# Altium schematic symbol library jlcpcb_2025_04_capacitors_extended_0603.schlib: 3668 symbols (part 8 of 20)
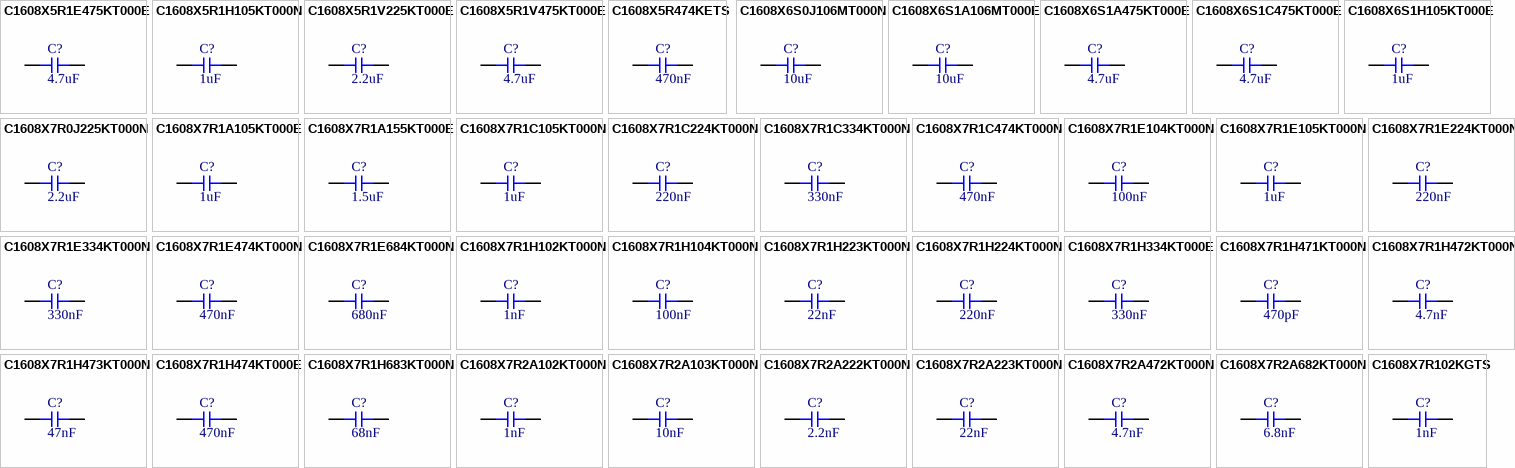
[diagram p98: symbols C1608X5R1E475KT000E to C1608X7R102KGTS]

## C1608X6S1H105KT000E
designator C?  Capacitance: 1uF  (hidden comment: *)
Capacitor, Ceramic (MLCC), 1uF, ±10%, 50V, X6S, ±10%, SMD 0603; Manufacturer: TDK; Manufacturer Part Number: C1608X6S1H105KT000E; Package Size: 0603; JLCPCB Basic Part: No; JLCPCB Part Number: C694180; Supplier 1: LCSC; Category: Capacitors - MLCC; Supplier Part Number 1: C694180; Tolerance: ±10%; Voltage Rating: 50V; Temperature Coefficient: X6S; RoHS: Yes; ComponentLink1Description: Datasheet; ComponentLink1URL: https://wmsc.lcsc.com/wmsc/upload/file/pdf/v2/lcsc/2304140030_TDK-C1608X6S1H105KT000E_C694180.pdf; ComponentLink2Description: JLCPCB Part URL; ComponentLink2URL: https://jlcpcb.com/partdetail/C694180; ComponentLink3Description: LCSC Part URL; ComponentLink3URL: https://lcsc.com/product-detail/Multilayer-Ceramic-Capacitors-MLCC---SMD-SMT_TDK-TDK-C1608X6S1H105KT000E_C694180.html
footprint CAP-0603 (0603 (1608M) Capacitor)
pins: 1, 2

## C1608X7R0J225KT000N
designator C?  Capacitance: 2.2uF  (hidden comment: *)
Capacitor, Ceramic (MLCC), 2.2uF, ±10%, 6.3V, X7R, ±10%, SMD 0603; Manufacturer: TDK; Manufacturer Part Number: C1608X7R0J225KT000N; Package Size: 0603; JLCPCB Basic Part: No; JLCPCB Part Number: C415294; Supplier 1: LCSC; Category: Capacitors - MLCC; Supplier Part Number 1: C415294; Tolerance: ±10%; Voltage Rating: 6.3V; Temperature Coefficient: X7R; RoHS: Yes; ComponentLink1Description: Datasheet; ComponentLink1URL: https://wmsc.lcsc.com/wmsc/upload/file/pdf/v2/lcsc/2304140030_TDK-C1608X7R0J225KT000N_C415294.pdf; ComponentLink2Description: JLCPCB Part URL; ComponentLink2URL: https://jlcpcb.com/partdetail/C415294; ComponentLink3Description: LCSC Part URL; ComponentLink3URL: https://lcsc.com/product-detail/Multilayer-Ceramic-Capacitors-MLCC---SMD-SMT_TDK-TDK-C1608X7R0J225KT000N_C415294.html
footprint CAP-0603 (0603 (1608M) Capacitor)
pins: 1, 2

## C1608X7R1A105KT000E
designator C?  Capacitance: 1uF  (hidden comment: *)
Capacitor, Ceramic (MLCC), 1uF, ±10%, 10V, X7R, ±10%, SMD 0603; Manufacturer: TDK; Manufacturer Part Number: C1608X7R1A105KT000E; Package Size: 0603; JLCPCB Basic Part: No; JLCPCB Part Number: C445753; Supplier 1: LCSC; Category: Capacitors - MLCC; Supplier Part Number 1: C445753; Tolerance: ±10%; Voltage Rating: 10V; Temperature Coefficient: X7R; RoHS: Yes; ComponentLink1Description: Datasheet; ComponentLink1URL: https://wmsc.lcsc.com/wmsc/upload/file/pdf/v2/lcsc/2304140030_TDK-C1608X7R1A105KT000E_C445753.pdf; ComponentLink2Description: JLCPCB Part URL; ComponentLink2URL: https://jlcpcb.com/partdetail/C445753; ComponentLink3Description: LCSC Part URL; ComponentLink3URL: https://lcsc.com/product-detail/Multilayer-Ceramic-Capacitors-MLCC---SMD-SMT_TDK-TDK-C1608X7R1A105KT000E_C445753.html
footprint CAP-0603 (0603 (1608M) Capacitor)
pins: 1, 2

## C1608X7R1A155KT000E
designator C?  Capacitance: 1.5uF  (hidden comment: *)
Capacitor, Ceramic (MLCC), 1.5uF, ±10%, 10V, X7R, ±10%, SMD 0603; Manufacturer: TDK; Manufacturer Part Number: C1608X7R1A155KT000E; Package Size: 0603; JLCPCB Basic Part: No; JLCPCB Part Number: C361193; Supplier 1: LCSC; Category: Capacitors - MLCC; Supplier Part Number 1: C361193; Tolerance: ±10%; Voltage Rating: 10V; Temperature Coefficient: X7R; RoHS: Yes; ComponentLink1Description: Datasheet; ComponentLink1URL: https://wmsc.lcsc.com/wmsc/upload/file/pdf/v2/lcsc/2304140030_TDK-C1608X7R1A155KT000E_C361193.pdf; ComponentLink2Description: JLCPCB Part URL; ComponentLink2URL: https://jlcpcb.com/partdetail/C361193; ComponentLink3Description: LCSC Part URL; ComponentLink3URL: https://lcsc.com/product-detail/Multilayer-Ceramic-Capacitors-MLCC---SMD-SMT_TDK-TDK-C1608X7R1A155KT000E_C361193.html
footprint CAP-0603 (0603 (1608M) Capacitor)
pins: 1, 2

## C1608X7R1C105KT000N
designator C?  Capacitance: 1uF  (hidden comment: *)
Capacitor, Ceramic (MLCC), 1uF, ±10%, 16V, X7R, ±10%, SMD 0603; Manufacturer: TDK; Manufacturer Part Number: C1608X7R1C105KT000N; Package Size: 0603; JLCPCB Basic Part: No; JLCPCB Part Number: C76617; Supplier 1: LCSC; Category: Capacitors - MLCC; Supplier Part Number 1: C76617; Tolerance: ±10%; Voltage Rating: 16V; Temperature Coefficient: X7R; RoHS: Yes; ComponentLink1Description: Datasheet; ComponentLink1URL: https://wmsc.lcsc.com/wmsc/upload/file/pdf/v2/lcsc/2304140030_TDK-C1608X7R1C105KT000N_C76617.pdf; ComponentLink2Description: JLCPCB Part URL; ComponentLink2URL: https://jlcpcb.com/partdetail/C76617; ComponentLink3Description: LCSC Part URL; ComponentLink3URL: https://lcsc.com/product-detail/Multilayer-Ceramic-Capacitors-MLCC---SMD-SMT_TDK-TDK-C1608X7R1C105KT000N_C76617.html
footprint CAP-0603 (0603 (1608M) Capacitor)
pins: 1, 2

## C1608X7R1C224KT000N
designator C?  Capacitance: 220nF  (hidden comment: *)
Capacitor, Ceramic (MLCC), 220nF, ±10%, 16V, X7R, ±10%, SMD 0603; Manufacturer: TDK; Manufacturer Part Number: C1608X7R1C224KT000N; Package Size: 0603; JLCPCB Basic Part: No; JLCPCB Part Number: C445748; Supplier 1: LCSC; Category: Capacitors - MLCC; Supplier Part Number 1: C445748; Tolerance: ±10%; Voltage Rating: 16V; Temperature Coefficient: X7R; RoHS: Yes; ComponentLink1Description: Datasheet; ComponentLink1URL: https://wmsc.lcsc.com/wmsc/upload/file/pdf/v2/lcsc/2304140030_TDK-C1608X7R1C224KT000N_C445748.pdf; ComponentLink2Description: JLCPCB Part URL; ComponentLink2URL: https://jlcpcb.com/partdetail/C445748; ComponentLink3Description: LCSC Part URL; ComponentLink3URL: https://lcsc.com/product-detail/Multilayer-Ceramic-Capacitors-MLCC---SMD-SMT_TDK-TDK-C1608X7R1C224KT000N_C445748.html
footprint CAP-0603 (0603 (1608M) Capacitor)
pins: 1, 2

## C1608X7R1C334KT000N
designator C?  Capacitance: 330nF  (hidden comment: *)
Capacitor, Ceramic (MLCC), 330nF, ±10%, 16V, X7R, ±10%, SMD 0603; Manufacturer: TDK; Manufacturer Part Number: C1608X7R1C334KT000N; Package Size: 0603; JLCPCB Basic Part: No; JLCPCB Part Number: C508854; Supplier 1: LCSC; Category: Capacitors - MLCC; Supplier Part Number 1: C508854; Tolerance: ±10%; Voltage Rating: 16V; Temperature Coefficient: X7R; RoHS: Yes; ComponentLink1Description: Datasheet; ComponentLink1URL: https://wmsc.lcsc.com/wmsc/upload/file/pdf/v2/lcsc/2304140030_TDK-C1608X7R1C334KT000N_C508854.pdf; ComponentLink2Description: JLCPCB Part URL; ComponentLink2URL: https://jlcpcb.com/partdetail/C508854; ComponentLink3Description: LCSC Part URL; ComponentLink3URL: https://lcsc.com/product-detail/Multilayer-Ceramic-Capacitors-MLCC---SMD-SMT_TDK-TDK-C1608X7R1C334KT000N_C508854.html
footprint CAP-0603 (0603 (1608M) Capacitor)
pins: 1, 2

## C1608X7R1C474KT000N
designator C?  Capacitance: 470nF  (hidden comment: *)
Capacitor, Ceramic (MLCC), 470nF, ±10%, 16V, X7R, ±10%, SMD 0603; Manufacturer: TDK; Manufacturer Part Number: C1608X7R1C474KT000N; Package Size: 0603; JLCPCB Basic Part: No; JLCPCB Part Number: C194073; Supplier 1: LCSC; Category: Capacitors - MLCC; Supplier Part Number 1: C194073; Tolerance: ±10%; Voltage Rating: 16V; Temperature Coefficient: X7R; RoHS: Yes; ComponentLink1Description: Datasheet; ComponentLink2Description: JLCPCB Part URL; ComponentLink2URL: https://jlcpcb.com/partdetail/C194073; ComponentLink3Description: LCSC Part URL; ComponentLink3URL: https://lcsc.com/product-detail/Multilayer-Ceramic-Capacitors-MLCC---SMD-SMT_TDK-TDK-C1608X7R1C474KT000N_C194073.html
footprint CAP-0603 (0603 (1608M) Capacitor)
pins: 1, 2

## C1608X7R1E104KT000N
designator C?  Capacitance: 100nF  (hidden comment: *)
Capacitor, Ceramic (MLCC), 100nF, ±10%, 25V, X7R, ±10%, SMD 0603; Manufacturer: TDK; Manufacturer Part Number: C1608X7R1E104KT000N; Package Size: 0603; JLCPCB Basic Part: No; JLCPCB Part Number: C338036; Supplier 1: LCSC; Category: Capacitors - MLCC; Supplier Part Number 1: C338036; Tolerance: ±10%; Voltage Rating: 25V; Temperature Coefficient: X7R; RoHS: Yes; ComponentLink1Description: Datasheet; ComponentLink1URL: https://wmsc.lcsc.com/wmsc/upload/file/pdf/v2/lcsc/2304140030_TDK-C1608X7R1E104KT000N_C338036.pdf; ComponentLink2Description: JLCPCB Part URL; ComponentLink2URL: https://jlcpcb.com/partdetail/C338036; ComponentLink3Description: LCSC Part URL; ComponentLink3URL: https://lcsc.com/product-detail/Multilayer-Ceramic-Capacitors-MLCC---SMD-SMT_TDK-TDK-C1608X7R1E104KT000N_C338036.html
footprint CAP-0603 (0603 (1608M) Capacitor)
pins: 1, 2

## C1608X7R1E105KT000N
designator C?  Capacitance: 1uF  (hidden comment: *)
Capacitor, Ceramic (MLCC), 1uF, ±10%, 25V, X7R, ±10%, SMD 0603; Manufacturer: TDK; Manufacturer Part Number: C1608X7R1E105KT000N; Package Size: 0603; JLCPCB Basic Part: No; JLCPCB Part Number: C76619; Supplier 1: LCSC; Category: Capacitors - MLCC; Supplier Part Number 1: C76619; Tolerance: ±10%; Voltage Rating: 25V; Temperature Coefficient: X7R; RoHS: Yes; ComponentLink1Description: Datasheet; ComponentLink1URL: https://wmsc.lcsc.com/wmsc/upload/file/pdf/v2/lcsc/2304140030_TDK-C1608X7R1E105KT000N_C76619.pdf; ComponentLink2Description: JLCPCB Part URL; ComponentLink2URL: https://jlcpcb.com/partdetail/C76619; ComponentLink3Description: LCSC Part URL; ComponentLink3URL: https://lcsc.com/product-detail/Multilayer-Ceramic-Capacitors-MLCC---SMD-SMT_TDK-TDK-C1608X7R1E105KT000N_C76619.html
footprint CAP-0603 (0603 (1608M) Capacitor)
pins: 1, 2

## C1608X7R1E224KT000N
designator C?  Capacitance: 220nF  (hidden comment: *)
Capacitor, Ceramic (MLCC), 220nF, ±10%, 25V, X7R, ±10%, SMD 0603; Manufacturer: TDK; Manufacturer Part Number: C1608X7R1E224KT000N; Package Size: 0603; JLCPCB Basic Part: No; JLCPCB Part Number: C445730; Supplier 1: LCSC; Category: Capacitors - MLCC; Supplier Part Number 1: C445730; Tolerance: ±10%; Voltage Rating: 25V; Temperature Coefficient: X7R; RoHS: Yes; ComponentLink1Description: Datasheet; ComponentLink1URL: https://wmsc.lcsc.com/wmsc/upload/file/pdf/v2/lcsc/2304140030_TDK-C1608X7R1E224KT000N_C445730.pdf; ComponentLink2Description: JLCPCB Part URL; ComponentLink2URL: https://jlcpcb.com/partdetail/C445730; ComponentLink3Description: LCSC Part URL; ComponentLink3URL: https://lcsc.com/product-detail/Multilayer-Ceramic-Capacitors-MLCC---SMD-SMT_TDK-TDK-C1608X7R1E224KT000N_C445730.html
footprint CAP-0603 (0603 (1608M) Capacitor)
pins: 1, 2

## C1608X7R1E334KT000N
designator C?  Capacitance: 330nF  (hidden comment: *)
Capacitor, Ceramic (MLCC), 330nF, ±10%, 25V, X7R, ±10%, SMD 0603; Manufacturer: TDK; Manufacturer Part Number: C1608X7R1E334KT000N; Package Size: 0603; JLCPCB Basic Part: No; JLCPCB Part Number: C76620; Supplier 1: LCSC; Category: Capacitors - MLCC; Supplier Part Number 1: C76620; Tolerance: ±10%; Voltage Rating: 25V; Temperature Coefficient: X7R; RoHS: Yes; ComponentLink1Description: Datasheet; ComponentLink1URL: https://wmsc.lcsc.com/wmsc/upload/file/pdf/v2/lcsc/2304140030_TDK-C1608X7R1E334KT000N_C76620.pdf; ComponentLink2Description: JLCPCB Part URL; ComponentLink2URL: https://jlcpcb.com/partdetail/C76620; ComponentLink3Description: LCSC Part URL; ComponentLink3URL: https://lcsc.com/product-detail/Multilayer-Ceramic-Capacitors-MLCC---SMD-SMT_TDK-TDK-C1608X7R1E334KT000N_C76620.html
footprint CAP-0603 (0603 (1608M) Capacitor)
pins: 1, 2

## C1608X7R1E474KT000N
designator C?  Capacitance: 470nF  (hidden comment: *)
Capacitor, Ceramic (MLCC), 470nF, ±10%, 25V, X7R, ±10%, SMD 0603; Manufacturer: TDK; Manufacturer Part Number: C1608X7R1E474KT000N; Package Size: 0603; JLCPCB Basic Part: No; JLCPCB Part Number: C694183; Supplier 1: LCSC; Category: Capacitors - MLCC; Supplier Part Number 1: C694183; Tolerance: ±10%; Voltage Rating: 25V; Temperature Coefficient: X7R; RoHS: Yes; ComponentLink1Description: Datasheet; ComponentLink1URL: https://wmsc.lcsc.com/wmsc/upload/file/pdf/v2/lcsc/2304140030_TDK-C1608X7R1E474KT000N_C694183.pdf; ComponentLink2Description: JLCPCB Part URL; ComponentLink2URL: https://jlcpcb.com/partdetail/C694183; ComponentLink3Description: LCSC Part URL; ComponentLink3URL: https://lcsc.com/product-detail/Multilayer-Ceramic-Capacitors-MLCC---SMD-SMT_TDK-TDK-C1608X7R1E474KT000N_C694183.html
footprint CAP-0603 (0603 (1608M) Capacitor)
pins: 1, 2

## C1608X7R1E684KT000N
designator C?  Capacitance: 680nF  (hidden comment: *)
Capacitor, Ceramic (MLCC), 680nF, ±10%, 25V, X7R, ±10%, SMD 0603; Manufacturer: TDK; Manufacturer Part Number: C1608X7R1E684KT000N; Package Size: 0603; JLCPCB Basic Part: No; JLCPCB Part Number: C694289; Supplier 1: LCSC; Category: Capacitors - MLCC; Supplier Part Number 1: C694289; Tolerance: ±10%; Voltage Rating: 25V; Temperature Coefficient: X7R; RoHS: Yes; ComponentLink1Description: Datasheet; ComponentLink1URL: https://wmsc.lcsc.com/wmsc/upload/file/pdf/v2/lcsc/2304140030_TDK-C1608X7R1E684KT000N_C694289.pdf; ComponentLink2Description: JLCPCB Part URL; ComponentLink2URL: https://jlcpcb.com/partdetail/C694289; ComponentLink3Description: LCSC Part URL; ComponentLink3URL: https://lcsc.com/product-detail/Multilayer-Ceramic-Capacitors-MLCC---SMD-SMT_TDK-TDK-C1608X7R1E684KT000N_C694289.html
footprint CAP-0603 (0603 (1608M) Capacitor)
pins: 1, 2

## C1608X7R1H102KT000N
designator C?  Capacitance: 1nF  (hidden comment: *)
Capacitor, Ceramic (MLCC), 1nF, ±10%, 50V, X7R, ±10%, SMD 0603; Manufacturer: TDK; Manufacturer Part Number: C1608X7R1H102KT000N; Package Size: 0603; JLCPCB Basic Part: No; JLCPCB Part Number: C432919; Supplier 1: LCSC; Category: Capacitors - MLCC; Supplier Part Number 1: C432919; Tolerance: ±10%; Voltage Rating: 50V; Temperature Coefficient: X7R; RoHS: Yes; ComponentLink1Description: Datasheet; ComponentLink1URL: https://wmsc.lcsc.com/wmsc/upload/file/pdf/v2/lcsc/2304140030_TDK-C1608X7R1H102KT000N_C432919.pdf; ComponentLink2Description: JLCPCB Part URL; ComponentLink2URL: https://jlcpcb.com/partdetail/C432919; ComponentLink3Description: LCSC Part URL; ComponentLink3URL: https://lcsc.com/product-detail/Multilayer-Ceramic-Capacitors-MLCC---SMD-SMT_TDK-TDK-C1608X7R1H102KT000N_C432919.html
footprint CAP-0603 (0603 (1608M) Capacitor)
pins: 1, 2

## C1608X7R1H104KT000N
designator C?  Capacitance: 100nF  (hidden comment: *)
Capacitor, Ceramic (MLCC), 100nF, ±10%, 50V, X7R, ±10%, SMD 0603; Manufacturer: TDK; Manufacturer Part Number: C1608X7R1H104KT000N; Package Size: 0603; JLCPCB Basic Part: No; JLCPCB Part Number: C56476; Supplier 1: LCSC; Category: Capacitors - MLCC; Supplier Part Number 1: C56476; Tolerance: ±10%; Voltage Rating: 50V; Temperature Coefficient: X7R; RoHS: Yes; ComponentLink1Description: Datasheet; ComponentLink1URL: https://wmsc.lcsc.com/wmsc/upload/file/pdf/v2/lcsc/2304140030_TDK-C1608X7R1H104KT000N_C56476.pdf; ComponentLink2Description: JLCPCB Part URL; ComponentLink2URL: https://jlcpcb.com/partdetail/C56476; ComponentLink3Description: LCSC Part URL; ComponentLink3URL: https://lcsc.com/product-detail/Multilayer-Ceramic-Capacitors-MLCC---SMD-SMT_TDK-TDK-C1608X7R1H104KT000N-_C56476.html
footprint CAP-0603 (0603 (1608M) Capacitor)
pins: 1, 2

## C1608X7R1H223KT000N
designator C?  Capacitance: 22nF  (hidden comment: *)
Capacitor, Ceramic (MLCC), 22nF, ±10%, 50V, X7R, ±10%, SMD 0603; Manufacturer: TDK; Manufacturer Part Number: C1608X7R1H223KT000N; Package Size: 0603; JLCPCB Basic Part: No; JLCPCB Part Number: C194074; Supplier 1: LCSC; Category: Capacitors - MLCC; Supplier Part Number 1: C194074; Tolerance: ±10%; Voltage Rating: 50V; Temperature Coefficient: X7R; RoHS: Yes; ComponentLink1Description: Datasheet; ComponentLink2Description: JLCPCB Part URL; ComponentLink2URL: https://jlcpcb.com/partdetail/C194074; ComponentLink3Description: LCSC Part URL; ComponentLink3URL: https://lcsc.com/product-detail/Multilayer-Ceramic-Capacitors-MLCC---SMD-SMT_TDK-TDK-C1608X7R1H223KT000N_C194074.html
footprint CAP-0603 (0603 (1608M) Capacitor)
pins: 1, 2

## C1608X7R1H224KT000N
designator C?  Capacitance: 220nF  (hidden comment: *)
Capacitor, Ceramic (MLCC), 220nF, ±10%, 50V, X7R, ±10%, SMD 0603; Manufacturer: TDK; Manufacturer Part Number: C1608X7R1H224KT000N; Package Size: 0603; JLCPCB Basic Part: No; JLCPCB Part Number: C445721; Supplier 1: LCSC; Category: Capacitors - MLCC; Supplier Part Number 1: C445721; Tolerance: ±10%; Voltage Rating: 50V; Temperature Coefficient: X7R; RoHS: Yes; ComponentLink1Description: Datasheet; ComponentLink1URL: https://wmsc.lcsc.com/wmsc/upload/file/pdf/v2/lcsc/2304140030_TDK-C1608X7R1H224KT000N_C445721.pdf; ComponentLink2Description: JLCPCB Part URL; ComponentLink2URL: https://jlcpcb.com/partdetail/C445721; ComponentLink3Description: LCSC Part URL; ComponentLink3URL: https://lcsc.com/product-detail/Multilayer-Ceramic-Capacitors-MLCC---SMD-SMT_TDK-TDK-C1608X7R1H224KT000N_C445721.html
footprint CAP-0603 (0603 (1608M) Capacitor)
pins: 1, 2

## C1608X7R1H334KT000E
designator C?  Capacitance: 330nF  (hidden comment: *)
Capacitor, Ceramic (MLCC), 330nF, ±10%, 50V, X7R, ±10%, SMD 0603; Manufacturer: TDK; Manufacturer Part Number: C1608X7R1H334KT000E; Package Size: 0603; JLCPCB Basic Part: No; JLCPCB Part Number: C76621; Supplier 1: LCSC; Category: Capacitors - MLCC; Supplier Part Number 1: C76621; Tolerance: ±10%; Voltage Rating: 50V; Temperature Coefficient: X7R; RoHS: Yes; ComponentLink1Description: Datasheet; ComponentLink1URL: https://wmsc.lcsc.com/wmsc/upload/file/pdf/v2/lcsc/2304140030_TDK-C1608X7R1H334KT000E_C76621.pdf; ComponentLink2Description: JLCPCB Part URL; ComponentLink2URL: https://jlcpcb.com/partdetail/C76621; ComponentLink3Description: LCSC Part URL; ComponentLink3URL: https://lcsc.com/product-detail/Multilayer-Ceramic-Capacitors-MLCC---SMD-SMT_TDK-TDK-C1608X7R1H334KT000E_C76621.html
footprint CAP-0603 (0603 (1608M) Capacitor)
pins: 1, 2

## C1608X7R1H471KT000N
designator C?  Capacitance: 470pF  (hidden comment: *)
Capacitor, Ceramic (MLCC), 470pF, ±10%, 50V, X7R, ±10%, SMD 0603; Manufacturer: TDK; Manufacturer Part Number: C1608X7R1H471KT000N; Package Size: 0603; JLCPCB Basic Part: No; JLCPCB Part Number: C695146; Supplier 1: LCSC; Category: Capacitors - MLCC; Supplier Part Number 1: C695146; Tolerance: ±10%; Voltage Rating: 50V; Temperature Coefficient: X7R; RoHS: Yes; ComponentLink1Description: Datasheet; ComponentLink1URL: https://wmsc.lcsc.com/wmsc/upload/file/pdf/v2/lcsc/2304140030_TDK-C1608X7R1H471KT000N_C695146.pdf; ComponentLink2Description: JLCPCB Part URL; ComponentLink2URL: https://jlcpcb.com/partdetail/C695146; ComponentLink3Description: LCSC Part URL; ComponentLink3URL: https://lcsc.com/product-detail/Multilayer-Ceramic-Capacitors-MLCC---SMD-SMT_TDK-TDK-C1608X7R1H471KT000N_C695146.html
footprint CAP-0603 (0603 (1608M) Capacitor)
pins: 1, 2

## C1608X7R1H472KT000N
designator C?  Capacitance: 4.7nF  (hidden comment: *)
Capacitor, Ceramic (MLCC), 4.7nF, ±10%, 50V, X7R, ±10%, SMD 0603; Manufacturer: TDK; Manufacturer Part Number: C1608X7R1H472KT000N; Package Size: 0603; JLCPCB Basic Part: No; JLCPCB Part Number: C516763; Supplier 1: LCSC; Category: Capacitors - MLCC; Supplier Part Number 1: C516763; Tolerance: ±10%; Voltage Rating: 50V; Temperature Coefficient: X7R; RoHS: Yes; ComponentLink1Description: Datasheet; ComponentLink1URL: https://wmsc.lcsc.com/wmsc/upload/file/pdf/v2/lcsc/2304140030_TDK-C1608X7R1H472KT000N_C516763.pdf; ComponentLink2Description: JLCPCB Part URL; ComponentLink2URL: https://jlcpcb.com/partdetail/C516763; ComponentLink3Description: LCSC Part URL; ComponentLink3URL: https://lcsc.com/product-detail/Multilayer-Ceramic-Capacitors-MLCC---SMD-SMT_TDK-TDK-C1608X7R1H472KT000N_C516763.html
footprint CAP-0603 (0603 (1608M) Capacitor)
pins: 1, 2

## C1608X7R1H473KT000N
designator C?  Capacitance: 47nF  (hidden comment: *)
Capacitor, Ceramic (MLCC), 47nF, ±10%, 50V, X7R, ±10%, SMD 0603; Manufacturer: TDK; Manufacturer Part Number: C1608X7R1H473KT000N; Package Size: 0603; JLCPCB Basic Part: No; JLCPCB Part Number: C380378; Supplier 1: LCSC; Category: Capacitors - MLCC; Supplier Part Number 1: C380378; Tolerance: ±10%; Voltage Rating: 50V; Temperature Coefficient: X7R; RoHS: Yes; ComponentLink1Description: Datasheet; ComponentLink1URL: https://wmsc.lcsc.com/wmsc/upload/file/pdf/v2/lcsc/2304140030_TDK-C1608X7R1H473KT000N_C380378.pdf; ComponentLink2Description: JLCPCB Part URL; ComponentLink2URL: https://jlcpcb.com/partdetail/C380378; ComponentLink3Description: LCSC Part URL; ComponentLink3URL: https://lcsc.com/product-detail/Multilayer-Ceramic-Capacitors-MLCC---SMD-SMT_TDK-TDK-C1608X7R1H473KT000N_C380378.html
footprint CAP-0603 (0603 (1608M) Capacitor)
pins: 1, 2

## C1608X7R1H474KT000E
designator C?  Capacitance: 470nF  (hidden comment: *)
Capacitor, Ceramic (MLCC), 470nF, ±10%, 50V, X7R, ±10%, SMD 0603; Manufacturer: TDK; Manufacturer Part Number: C1608X7R1H474KT000E; Package Size: 0603; JLCPCB Basic Part: No; JLCPCB Part Number: C361189; Supplier 1: LCSC; Category: Capacitors - MLCC; Supplier Part Number 1: C361189; Tolerance: ±10%; Voltage Rating: 50V; Temperature Coefficient: X7R; RoHS: Yes; ComponentLink1Description: Datasheet; ComponentLink1URL: https://wmsc.lcsc.com/wmsc/upload/file/pdf/v2/lcsc/2304140030_TDK-C1608X7R1H474KT000E_C361189.pdf; ComponentLink2Description: JLCPCB Part URL; ComponentLink2URL: https://jlcpcb.com/partdetail/C361189; ComponentLink3Description: LCSC Part URL; ComponentLink3URL: https://lcsc.com/product-detail/Multilayer-Ceramic-Capacitors-MLCC---SMD-SMT_TDK-TDK-C1608X7R1H474KT000E_C361189.html
footprint CAP-0603 (0603 (1608M) Capacitor)
pins: 1, 2

## C1608X7R1H683KT000N
designator C?  Capacitance: 68nF  (hidden comment: *)
Capacitor, Ceramic (MLCC), 68nF, ±10%, 50V, X7R, ±10%, SMD 0603; Manufacturer: TDK; Manufacturer Part Number: C1608X7R1H683KT000N; Package Size: 0603; JLCPCB Basic Part: No; JLCPCB Part Number: C694291; Supplier 1: LCSC; Category: Capacitors - MLCC; Supplier Part Number 1: C694291; Tolerance: ±10%; Voltage Rating: 50V; Temperature Coefficient: X7R; RoHS: Yes; ComponentLink1Description: Datasheet; ComponentLink1URL: https://wmsc.lcsc.com/wmsc/upload/file/pdf/v2/lcsc/2304140030_TDK-C1608X7R1H683KT000N_C694291.pdf; ComponentLink2Description: JLCPCB Part URL; ComponentLink2URL: https://jlcpcb.com/partdetail/C694291; ComponentLink3Description: LCSC Part URL; ComponentLink3URL: https://lcsc.com/product-detail/Multilayer-Ceramic-Capacitors-MLCC---SMD-SMT_TDK-TDK-C1608X7R1H683KT000N_C694291.html
footprint CAP-0603 (0603 (1608M) Capacitor)
pins: 1, 2

## C1608X7R2A102KT000N
designator C?  Capacitance: 1nF  (hidden comment: *)
Capacitor, Ceramic (MLCC), 1nF, ±10%, 100V, X7R, ±10%, SMD 0603; Manufacturer: TDK; Manufacturer Part Number: C1608X7R2A102KT000N; Package Size: 0603; JLCPCB Basic Part: No; JLCPCB Part Number: C342527; Supplier 1: LCSC; Category: Capacitors - MLCC; Supplier Part Number 1: C342527; Tolerance: ±10%; Voltage Rating: 100V; Temperature Coefficient: X7R; RoHS: Yes; ComponentLink1Description: Datasheet; ComponentLink1URL: https://wmsc.lcsc.com/wmsc/upload/file/pdf/v2/lcsc/2304140030_TDK-C1608X7R2A102KT000N_C342527.pdf; ComponentLink2Description: JLCPCB Part URL; ComponentLink2URL: https://jlcpcb.com/partdetail/C342527; ComponentLink3Description: LCSC Part URL; ComponentLink3URL: https://lcsc.com/product-detail/Multilayer-Ceramic-Capacitors-MLCC---SMD-SMT_TDK-TDK-C1608X7R2A102KT000N_C342527.html
footprint CAP-0603 (0603 (1608M) Capacitor)
pins: 1, 2

## C1608X7R2A103KT000N
designator C?  Capacitance: 10nF  (hidden comment: *)
Capacitor, Ceramic (MLCC), 10nF, ±10%, 100V, X7R, ±10%, SMD 0603; Manufacturer: TDK; Manufacturer Part Number: C1608X7R2A103KT000N; Package Size: 0603; JLCPCB Basic Part: No; JLCPCB Part Number: C342523; Supplier 1: LCSC; Category: Capacitors - MLCC; Supplier Part Number 1: C342523; Tolerance: ±10%; Voltage Rating: 100V; Temperature Coefficient: X7R; RoHS: Yes; ComponentLink1Description: Datasheet; ComponentLink1URL: https://wmsc.lcsc.com/wmsc/upload/file/pdf/v2/lcsc/2304140030_TDK-C1608X7R2A103KT000N_C342523.pdf; ComponentLink2Description: JLCPCB Part URL; ComponentLink2URL: https://jlcpcb.com/partdetail/C342523; ComponentLink3Description: LCSC Part URL; ComponentLink3URL: https://lcsc.com/product-detail/Multilayer-Ceramic-Capacitors-MLCC---SMD-SMT_TDK-TDK-C1608X7R2A103KT000N_C342523.html
footprint CAP-0603 (0603 (1608M) Capacitor)
pins: 1, 2

## C1608X7R2A222KT000N
designator C?  Capacitance: 2.2nF  (hidden comment: *)
Capacitor, Ceramic (MLCC), 2.2nF, ±10%, 100V, X7R, ±10%, SMD 0603; Manufacturer: TDK; Manufacturer Part Number: C1608X7R2A222KT000N; Package Size: 0603; JLCPCB Basic Part: No; JLCPCB Part Number: C342518; Supplier 1: LCSC; Category: Capacitors - MLCC; Supplier Part Number 1: C342518; Tolerance: ±10%; Voltage Rating: 100V; Temperature Coefficient: X7R; RoHS: Yes; ComponentLink1Description: Datasheet; ComponentLink1URL: https://wmsc.lcsc.com/wmsc/upload/file/pdf/v2/lcsc/2304140030_TDK-C1608X7R2A222KT000N_C342518.pdf; ComponentLink2Description: JLCPCB Part URL; ComponentLink2URL: https://jlcpcb.com/partdetail/C342518; ComponentLink3Description: LCSC Part URL; ComponentLink3URL: https://lcsc.com/product-detail/Multilayer-Ceramic-Capacitors-MLCC---SMD-SMT_TDK-TDK-C1608X7R2A222KT000N_C342518.html
footprint CAP-0603 (0603 (1608M) Capacitor)
pins: 1, 2

## C1608X7R2A223KT000N
designator C?  Capacitance: 22nF  (hidden comment: *)
Capacitor, Ceramic (MLCC), 22nF, ±10%, 100V, X7R, ±10%, SMD 0603; Manufacturer: TDK; Manufacturer Part Number: C1608X7R2A223KT000N; Package Size: 0603; JLCPCB Basic Part: No; JLCPCB Part Number: C342519; Supplier 1: LCSC; Category: Capacitors - MLCC; Supplier Part Number 1: C342519; Tolerance: ±10%; Voltage Rating: 100V; Temperature Coefficient: X7R; RoHS: Yes; ComponentLink1Description: Datasheet; ComponentLink1URL: https://wmsc.lcsc.com/wmsc/upload/file/pdf/v2/lcsc/1912111437_TDK-C1608X7R2A223KT000N_C342519.pdf; ComponentLink2Description: JLCPCB Part URL; ComponentLink2URL: https://jlcpcb.com/partdetail/C342519; ComponentLink3Description: LCSC Part URL; ComponentLink3URL: https://lcsc.com/product-detail/Multilayer-Ceramic-Capacitors-MLCC---SMD-SMT_TDK-TDK-C1608X7R2A223KT000N_C342519.html
footprint CAP-0603 (0603 (1608M) Capacitor)
pins: 1, 2

## C1608X7R2A472KT000N
designator C?  Capacitance: 4.7nF  (hidden comment: *)
Capacitor, Ceramic (MLCC), 4.7nF, ±10%, 100V, X7R, ±10%, SMD 0603; Manufacturer: TDK; Manufacturer Part Number: C1608X7R2A472KT000N; Package Size: 0603; JLCPCB Basic Part: No; JLCPCB Part Number: C342520; Supplier 1: LCSC; Category: Capacitors - MLCC; Supplier Part Number 1: C342520; Tolerance: ±10%; Voltage Rating: 100V; Temperature Coefficient: X7R; RoHS: Yes; ComponentLink1Description: Datasheet; ComponentLink1URL: https://wmsc.lcsc.com/wmsc/upload/file/pdf/v2/lcsc/2304140030_TDK-C1608X7R2A472KT000N_C342520.pdf; ComponentLink2Description: JLCPCB Part URL; ComponentLink2URL: https://jlcpcb.com/partdetail/C342520; ComponentLink3Description: LCSC Part URL; ComponentLink3URL: https://lcsc.com/product-detail/Multilayer-Ceramic-Capacitors-MLCC---SMD-SMT_TDK-TDK-C1608X7R2A472KT000N_C342520.html
footprint CAP-0603 (0603 (1608M) Capacitor)
pins: 1, 2

## C1608X7R2A682KT000N
designator C?  Capacitance: 6.8nF  (hidden comment: *)
Capacitor, Ceramic (MLCC), 6.8nF, ±10%, 100V, X7R, ±10%, SMD 0603; Manufacturer: TDK; Manufacturer Part Number: C1608X7R2A682KT000N; Package Size: 0603; JLCPCB Basic Part: No; JLCPCB Part Number: C694293; Supplier 1: LCSC; Category: Capacitors - MLCC; Supplier Part Number 1: C694293; Tolerance: ±10%; Voltage Rating: 100V; Temperature Coefficient: X7R; RoHS: Yes; ComponentLink1Description: Datasheet; ComponentLink1URL: https://wmsc.lcsc.com/wmsc/upload/file/pdf/v2/lcsc/2304140030_TDK-C1608X7R2A682KT000N_C694293.pdf; ComponentLink2Description: JLCPCB Part URL; ComponentLink2URL: https://jlcpcb.com/partdetail/C694293; ComponentLink3Description: LCSC Part URL; ComponentLink3URL: https://lcsc.com/product-detail/Multilayer-Ceramic-Capacitors-MLCC---SMD-SMT_TDK-TDK-C1608X7R2A682KT000N_C694293.html
footprint CAP-0603 (0603 (1608M) Capacitor)
pins: 1, 2

## C1608X7R102KGTS
designator C?  Capacitance: 1nF  (hidden comment: *)
Capacitor, Ceramic (MLCC), 1nF, ±10%, 50V, X7R, ±10%, SMD 0603; Manufacturer: Darfon Elec; Manufacturer Part Number: C1608X7R102KGTS; Package Size: 0603; JLCPCB Basic Part: No; JLCPCB Part Number: C718541; Supplier 1: LCSC; Category: Capacitors - MLCC; Supplier Part Number 1: C718541; Tolerance: ±10%; Voltage Rating: 50V; Temperature Coefficient: X7R; RoHS: Yes; ComponentLink1Description: Datasheet; ComponentLink1URL: https://wmsc.lcsc.com/wmsc/upload/file/pdf/v2/lcsc/2304140030_Darfon-Elec-C1608X7R102KGTS_C718541.pdf; ComponentLink2Description: JLCPCB Part URL; ComponentLink2URL: https://jlcpcb.com/partdetail/C718541; ComponentLink3Description: LCSC Part URL; ComponentLink3URL: https://lcsc.com/product-detail/Multilayer-Ceramic-Capacitors-MLCC---SMD-SMT_Darfon-Elec-Darfon-Elec-C1608X7R102KGTS_C718541.html
footprint CAP-0603 (0603 (1608M) Capacitor)
pins: 1, 2

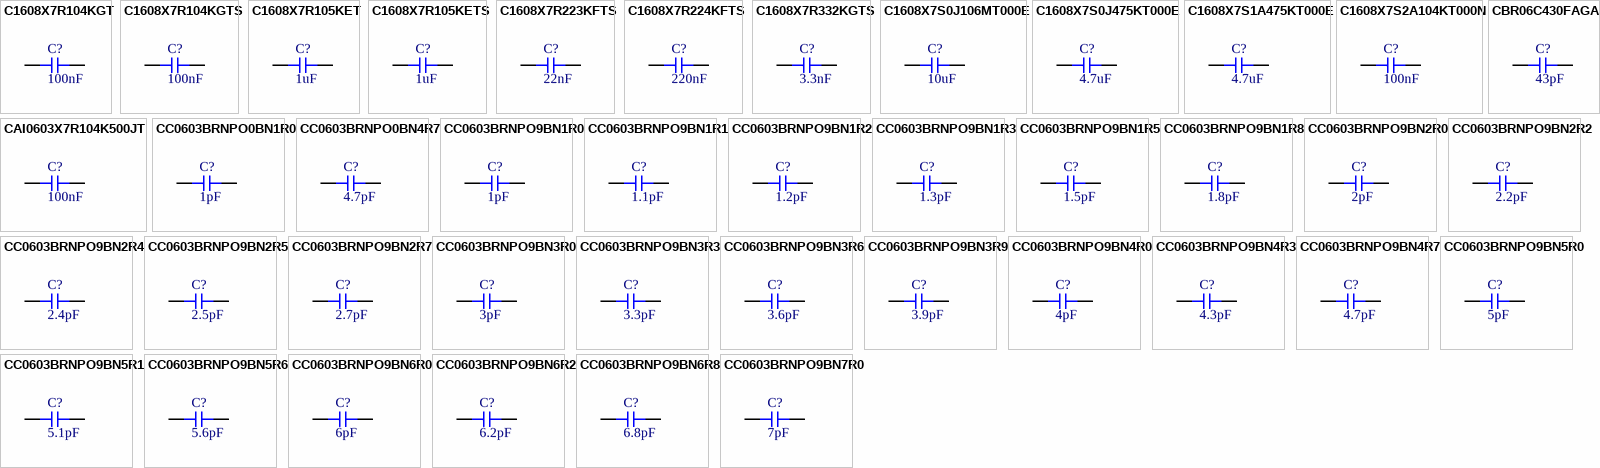
[diagram p33: symbols C1608X7R104KGT to CC0603BRNPO9BN7R0]

## C1608X7R104KGT
designator C?  Capacitance: 100nF  (hidden comment: *)
Capacitor, Ceramic (MLCC), 100nF, ±10%, 50V, X7R, ±10%, SMD 0603; Manufacturer: Darfon Elec; Manufacturer Part Number: C1608X7R104KGT; Package Size: 0603; JLCPCB Basic Part: No; JLCPCB Part Number: C701321; Supplier 1: LCSC; Category: Capacitors - MLCC; Supplier Part Number 1: C701321; Tolerance: ±10%; Voltage Rating: 50V; Temperature Coefficient: X7R; RoHS: Yes; ComponentLink1Description: Datasheet; ComponentLink1URL: https://wmsc.lcsc.com/wmsc/upload/file/pdf/v2/lcsc/2304140030_Darfon-Elec-C1608X7R104KGT_C701321.pdf; ComponentLink2Description: JLCPCB Part URL; ComponentLink2URL: https://jlcpcb.com/partdetail/C701321; ComponentLink3Description: LCSC Part URL; ComponentLink3URL: https://lcsc.com/product-detail/Multilayer-Ceramic-Capacitors-MLCC---SMD-SMT_Darfon-Elec-Darfon-Elec-C1608X7R104KGT_C701321.html
footprint CAP-0603 (0603 (1608M) Capacitor)
pins: 1, 2

## C1608X7R104KGTS
designator C?  Capacitance: 100nF  (hidden comment: *)
Capacitor, Ceramic (MLCC), 100nF, ±10%, 50V, X7R, ±10%, SMD 0603; Manufacturer: Darfon Elec; Manufacturer Part Number: C1608X7R104KGTS; Package Size: 0603; JLCPCB Basic Part: No; JLCPCB Part Number: C335111; Supplier 1: LCSC; Category: Capacitors - MLCC; Supplier Part Number 1: C335111; Tolerance: ±10%; Voltage Rating: 50V; Temperature Coefficient: X7R; RoHS: Yes; ComponentLink1Description: Datasheet; ComponentLink1URL: https://wmsc.lcsc.com/wmsc/upload/file/pdf/v2/lcsc/2304140030_Darfon-Elec-C1608X7R104KGTS_C335111.pdf; ComponentLink2Description: JLCPCB Part URL; ComponentLink2URL: https://jlcpcb.com/partdetail/C335111; ComponentLink3Description: LCSC Part URL; ComponentLink3URL: https://lcsc.com/product-detail/Multilayer-Ceramic-Capacitors-MLCC---SMD-SMT_Darfon-Elec-Darfon-Elec-C1608X7R104KGTS_C335111.html
footprint CAP-0603 (0603 (1608M) Capacitor)
pins: 1, 2

## C1608X7R105KET
designator C?  Capacitance: 1uF  (hidden comment: *)
Capacitor, Ceramic (MLCC), 1uF, ±10%, 16V, X7R, ±10%, SMD 0603; Manufacturer: Darfon Elec; Manufacturer Part Number: C1608X7R105KET; Package Size: 0603; JLCPCB Basic Part: No; JLCPCB Part Number: C701320; Supplier 1: LCSC; Category: Capacitors - MLCC; Supplier Part Number 1: C701320; Tolerance: ±10%; Voltage Rating: 16V; Temperature Coefficient: X7R; RoHS: Yes; ComponentLink1Description: Datasheet; ComponentLink1URL: https://wmsc.lcsc.com/wmsc/upload/file/pdf/v2/lcsc/2304140030_Darfon-Elec-C1608X7R105KET_C701320.pdf; ComponentLink2Description: JLCPCB Part URL; ComponentLink2URL: https://jlcpcb.com/partdetail/C701320; ComponentLink3Description: LCSC Part URL; ComponentLink3URL: https://lcsc.com/product-detail/Multilayer-Ceramic-Capacitors-MLCC---SMD-SMT_Darfon-Elec-Darfon-Elec-C1608X7R105KET_C701320.html
footprint CAP-0603 (0603 (1608M) Capacitor)
pins: 1, 2

## C1608X7R105KETS
designator C?  Capacitance: 1uF  (hidden comment: *)
Capacitor, Ceramic (MLCC), 1uF, ±10%, 16V, X7R, ±10%, SMD 0603; Manufacturer: Darfon Elec; Manufacturer Part Number: C1608X7R105KETS; Package Size: 0603; JLCPCB Basic Part: No; JLCPCB Part Number: C725572; Supplier 1: LCSC; Category: Capacitors - MLCC; Supplier Part Number 1: C725572; Tolerance: ±10%; Voltage Rating: 16V; Temperature Coefficient: X7R; RoHS: Yes; ComponentLink1Description: Datasheet; ComponentLink1URL: https://wmsc.lcsc.com/wmsc/upload/file/pdf/v2/lcsc/2304140030_Darfon-Elec-C1608X7R105KETS_C725572.pdf; ComponentLink2Description: JLCPCB Part URL; ComponentLink2URL: https://jlcpcb.com/partdetail/C725572; ComponentLink3Description: LCSC Part URL; ComponentLink3URL: https://lcsc.com/product-detail/Multilayer-Ceramic-Capacitors-MLCC---SMD-SMT_Darfon-Elec-Darfon-Elec-C1608X7R105KETS_C725572.html
footprint CAP-0603 (0603 (1608M) Capacitor)
pins: 1, 2

## C1608X7R223KFTS
designator C?  Capacitance: 22nF  (hidden comment: *)
Capacitor, Ceramic (MLCC), 22nF, ±10%, 25V, X7R, ±10%, SMD 0603; Manufacturer: Darfon Elec; Manufacturer Part Number: C1608X7R223KFTS; Package Size: 0603; JLCPCB Basic Part: No; JLCPCB Part Number: C561175; Supplier 1: LCSC; Category: Capacitors - MLCC; Supplier Part Number 1: C561175; Tolerance: ±10%; Voltage Rating: 25V; Temperature Coefficient: X7R; RoHS: Yes; ComponentLink1Description: Datasheet; ComponentLink1URL: https://wmsc.lcsc.com/wmsc/upload/file/pdf/v2/lcsc/2006011904_Darfon-Elec-C1608X7R223KFTS_C561175.pdf; ComponentLink2Description: JLCPCB Part URL; ComponentLink2URL: https://jlcpcb.com/partdetail/C561175; ComponentLink3Description: LCSC Part URL; ComponentLink3URL: https://lcsc.com/product-detail/Multilayer-Ceramic-Capacitors-MLCC---SMD-SMT_Darfon-Elec-Darfon-Elec-C1608X7R223KFTS_C561175.html
footprint CAP-0603 (0603 (1608M) Capacitor)
pins: 1, 2

## C1608X7R224KFTS
designator C?  Capacitance: 220nF  (hidden comment: *)
Capacitor, Ceramic (MLCC), 220nF, ±10%, 25V, X5R, ±10%, SMD 0603; Manufacturer: Darfon Elec; Manufacturer Part Number: C1608X7R224KFTS; Package Size: 0603; JLCPCB Basic Part: No; JLCPCB Part Number: C911096; Supplier 1: LCSC; Category: Capacitors - MLCC; Supplier Part Number 1: C911096; Tolerance: ±10%; Voltage Rating: 25V; Temperature Coefficient: X5R; RoHS: Yes; ComponentLink1Description: Datasheet; ComponentLink1URL: https://wmsc.lcsc.com/wmsc/upload/file/pdf/v2/lcsc/2010292207_Darfon-Elec-C1608X7R224KFTS_C911096.pdf; ComponentLink2Description: JLCPCB Part URL; ComponentLink2URL: https://jlcpcb.com/partdetail/C911096; ComponentLink3Description: LCSC Part URL; ComponentLink3URL: https://lcsc.com/product-detail/Multilayer-Ceramic-Capacitors-MLCC---SMD-SMT_Darfon-Elec-Darfon-Elec-C1608X7R224KFTS_C911096.html
footprint CAP-0603 (0603 (1608M) Capacitor)
pins: 1, 2

## C1608X7R332KGTS
designator C?  Capacitance: 3.3nF  (hidden comment: *)
Capacitor, Ceramic (MLCC), 3.3nF, ±10%, 50V, X7R, ±10%, SMD 0603; Manufacturer: Darfon Elec; Manufacturer Part Number: C1608X7R332KGTS; Package Size: 0603; JLCPCB Basic Part: No; JLCPCB Part Number: C561177; Supplier 1: LCSC; Category: Capacitors - MLCC; Supplier Part Number 1: C561177; Tolerance: ±10%; Voltage Rating: 50V; Temperature Coefficient: X7R; RoHS: Yes; ComponentLink1Description: Datasheet; ComponentLink1URL: https://wmsc.lcsc.com/wmsc/upload/file/pdf/v2/lcsc/2304140030_Darfon-Elec-C1608X7R332KGTS_C561177.pdf; ComponentLink2Description: JLCPCB Part URL; ComponentLink2URL: https://jlcpcb.com/partdetail/C561177; ComponentLink3Description: LCSC Part URL; ComponentLink3URL: https://lcsc.com/product-detail/Multilayer-Ceramic-Capacitors-MLCC---SMD-SMT_Darfon-Elec-Darfon-Elec-C1608X7R332KGTS_C561177.html
footprint CAP-0603 (0603 (1608M) Capacitor)
pins: 1, 2

## C1608X7S0J106MT000E
designator C?  Capacitance: 10uF  (hidden comment: *)
Capacitor, Ceramic (MLCC), 10uF, ±20%, 6.3V, X7S, ±20%, SMD 0603; Manufacturer: TDK; Manufacturer Part Number: C1608X7S0J106MT000E; Package Size: 0603; JLCPCB Basic Part: No; JLCPCB Part Number: C342847; Supplier 1: LCSC; Category: Capacitors - MLCC; Supplier Part Number 1: C342847; Tolerance: ±20%; Voltage Rating: 6.3V; Temperature Coefficient: X7S; RoHS: Yes; ComponentLink1Description: Datasheet; ComponentLink1URL: https://wmsc.lcsc.com/wmsc/upload/file/pdf/v2/lcsc/2304140030_TDK-C1608X7S0J106MT000E_C342847.pdf; ComponentLink2Description: JLCPCB Part URL; ComponentLink2URL: https://jlcpcb.com/partdetail/C342847; ComponentLink3Description: LCSC Part URL; ComponentLink3URL: https://lcsc.com/product-detail/Multilayer-Ceramic-Capacitors-MLCC---SMD-SMT_TDK-TDK-C1608X7S0J106MT000E_C342847.html
footprint CAP-0603 (0603 (1608M) Capacitor)
pins: 1, 2

## C1608X7S0J475KT000E
designator C?  Capacitance: 4.7uF  (hidden comment: *)
Capacitor, Ceramic (MLCC), 4.7uF, ±10%, 6.3V, X7S, ±10%, SMD 0603; Manufacturer: TDK; Manufacturer Part Number: C1608X7S0J475KT000E; Package Size: 0603; JLCPCB Basic Part: No; JLCPCB Part Number: C342970; Supplier 1: LCSC; Category: Capacitors - MLCC; Supplier Part Number 1: C342970; Tolerance: ±10%; Voltage Rating: 6.3V; Temperature Coefficient: X7S; RoHS: Yes; ComponentLink1Description: Datasheet; ComponentLink1URL: https://wmsc.lcsc.com/wmsc/upload/file/pdf/v2/lcsc/2304140030_TDK-C1608X7S0J475KT000E_C342970.pdf; ComponentLink2Description: JLCPCB Part URL; ComponentLink2URL: https://jlcpcb.com/partdetail/C342970; ComponentLink3Description: LCSC Part URL; ComponentLink3URL: https://lcsc.com/product-detail/Multilayer-Ceramic-Capacitors-MLCC---SMD-SMT_TDK-TDK-C1608X7S0J475KT000E_C342970.html
footprint CAP-0603 (0603 (1608M) Capacitor)
pins: 1, 2

## C1608X7S1A475KT000E
designator C?  Capacitance: 4.7uF  (hidden comment: *)
Capacitor, Ceramic (MLCC), 4.7uF, ±10%, 10V, X7S, ±10%, SMD 0603; Manufacturer: TDK; Manufacturer Part Number: C1608X7S1A475KT000E; Package Size: 0603; JLCPCB Basic Part: No; JLCPCB Part Number: C342959; Supplier 1: LCSC; Category: Capacitors - MLCC; Supplier Part Number 1: C342959; Tolerance: ±10%; Voltage Rating: 10V; Temperature Coefficient: X7S; RoHS: Yes; ComponentLink1Description: Datasheet; ComponentLink1URL: https://wmsc.lcsc.com/wmsc/upload/file/pdf/v2/lcsc/2304140030_TDK-C1608X7S1A475KT000E_C342959.pdf; ComponentLink2Description: JLCPCB Part URL; ComponentLink2URL: https://jlcpcb.com/partdetail/C342959; ComponentLink3Description: LCSC Part URL; ComponentLink3URL: https://lcsc.com/product-detail/Multilayer-Ceramic-Capacitors-MLCC---SMD-SMT_TDK-TDK-C1608X7S1A475KT000E_C342959.html
footprint CAP-0603 (0603 (1608M) Capacitor)
pins: 1, 2

## C1608X7S2A104KT000N
designator C?  Capacitance: 100nF  (hidden comment: *)
Capacitor, Ceramic (MLCC), 100nF, ±10%, 100V, X7S, ±10%, SMD 0603; Manufacturer: TDK; Manufacturer Part Number: C1608X7S2A104KT000N; Package Size: 0603; JLCPCB Basic Part: No; JLCPCB Part Number: C343025; Supplier 1: LCSC; Category: Capacitors - MLCC; Supplier Part Number 1: C343025; Tolerance: ±10%; Voltage Rating: 100V; Temperature Coefficient: X7S; RoHS: Yes; ComponentLink1Description: Datasheet; ComponentLink1URL: https://wmsc.lcsc.com/wmsc/upload/file/pdf/v2/lcsc/2304140030_TDK-C1608X7S2A104KT000N_C343025.pdf; ComponentLink2Description: JLCPCB Part URL; ComponentLink2URL: https://jlcpcb.com/partdetail/C343025; ComponentLink3Description: LCSC Part URL; ComponentLink3URL: https://lcsc.com/product-detail/Multilayer-Ceramic-Capacitors-MLCC---SMD-SMT_TDK-TDK-C1608X7S2A104KT000N_C343025.html
footprint CAP-0603 (0603 (1608M) Capacitor)
pins: 1, 2

## CAI0603X7R104K500JT
designator C?  Capacitance: 100nF  (hidden comment: *)
Capacitor, Ceramic (MLCC), 100nF, ±10%, 50V, X7R, ±10%, SMD 0603; Manufacturer: HRE; Manufacturer Part Number: CAI0603X7R104K500JT; Package Size: 0603; JLCPCB Basic Part: No; JLCPCB Part Number: C7496657; Supplier 1: LCSC; Category: Capacitors - MLCC; Supplier Part Number 1: C7496657; Tolerance: ±10%; Voltage Rating: 50V; Temperature Coefficient: X7R; RoHS: Yes; ComponentLink1Description: Datasheet; ComponentLink1URL: https://wmsc.lcsc.com/wmsc/upload/file/pdf/v2/lcsc/2401151607_HRE-CAI0603X7R104K500JT_C7496657.pdf; ComponentLink2Description: JLCPCB Part URL; ComponentLink2URL: https://jlcpcb.com/partdetail/C7496657; ComponentLink3Description: LCSC Part URL; ComponentLink3URL: https://lcsc.com/product-detail/Multilayer-Ceramic-Capacitors-MLCC---SMD-SMT_HRE-HRE-CAI0603X7R104K500JT_C7496657.html
footprint CAP-0603 (0603 (1608M) Capacitor)
pins: 1, 2

## CBR06C430FAGAC
designator C?  Capacitance: 43pF  (hidden comment: *)
Capacitor, Ceramic (MLCC), 43pF, ±1%, 250V, null, ±1%, SMD 0603; Manufacturer: KEMET; Manufacturer Part Number: CBR06C430FAGAC; Package Size: 0603; JLCPCB Basic Part: No; JLCPCB Part Number: C2170918; Supplier 1: LCSC; Category: Capacitors - MLCC; Supplier Part Number 1: C2170918; Tolerance: ±1%; Voltage Rating: 250V; Temperature Coefficient: null; RoHS: Yes; ComponentLink1Description: Datasheet; ComponentLink1URL: https://wmsc.lcsc.com/wmsc/upload/file/pdf/v2/lcsc/2304140030_KEMET-CBR06C430FAGAC_C2170918.pdf; ComponentLink2Description: JLCPCB Part URL; ComponentLink2URL: https://jlcpcb.com/partdetail/C2170918; ComponentLink3Description: LCSC Part URL; ComponentLink3URL: https://lcsc.com/product-detail/Multilayer-Ceramic-Capacitors-MLCC---SMD-SMT_KEMET-KEMET-CBR06C430FAGAC_C2170918.html
footprint CAP-0603 (0603 (1608M) Capacitor)
pins: 1, 2

## CC0603BRNPO0BN1R0
designator C?  Capacitance: 1pF  (hidden comment: *)
Capacitor, Ceramic (MLCC), 1pF, 100V, NP0, SMD 0603; Manufacturer: YAGEO; Manufacturer Part Number: CC0603BRNPO0BN1R0; Package Size: 0603; JLCPCB Basic Part: No; JLCPCB Part Number: C576760; Supplier 1: LCSC; Category: Capacitors - MLCC; Supplier Part Number 1: C576760; Voltage Rating: 100V; Temperature Coefficient: NP0; RoHS: Yes; ComponentLink1Description: Datasheet; ComponentLink1URL: https://wmsc.lcsc.com/wmsc/upload/file/pdf/v2/lcsc/2201131030_YAGEO-CC0603BRNPO0BN1R0_C576760.pdf; ComponentLink2Description: JLCPCB Part URL; ComponentLink2URL: https://jlcpcb.com/partdetail/C576760; ComponentLink3Description: LCSC Part URL; ComponentLink3URL: https://lcsc.com/product-detail/Multilayer-Ceramic-Capacitors-MLCC---SMD-SMT_YAGEO-YAGEO-CC0603BRNPO0BN1R0_C576760.html
footprint CAP-0603 (0603 (1608M) Capacitor)
pins: 1, 2

## CC0603BRNPO0BN4R7
designator C?  Capacitance: 4.7pF  (hidden comment: *)
Capacitor, Ceramic (MLCC), 4.7pF, 100V, NP0, SMD 0603; Manufacturer: YAGEO; Manufacturer Part Number: CC0603BRNPO0BN4R7; Package Size: 0603; JLCPCB Basic Part: No; JLCPCB Part Number: C527034; Supplier 1: LCSC; Category: Capacitors - MLCC; Supplier Part Number 1: C527034; Voltage Rating: 100V; Temperature Coefficient: NP0; RoHS: Yes; ComponentLink1Description: Datasheet; ComponentLink1URL: https://wmsc.lcsc.com/wmsc/upload/file/pdf/v2/lcsc/2006101834_YAGEO-CC0603BRNPO0BN4R7_C527034.pdf; ComponentLink2Description: JLCPCB Part URL; ComponentLink2URL: https://jlcpcb.com/partdetail/C527034; ComponentLink3Description: LCSC Part URL; ComponentLink3URL: https://lcsc.com/product-detail/Multilayer-Ceramic-Capacitors-MLCC---SMD-SMT_YAGEO-YAGEO-CC0603BRNPO0BN4R7_C527034.html
footprint CAP-0603 (0603 (1608M) Capacitor)
pins: 1, 2
